# Altium schematic symbol library Regulator_Linear.SchLib: 1538 symbols (part 3 of 9) (continued)
## LD3985M122R_SOT23 (continued)
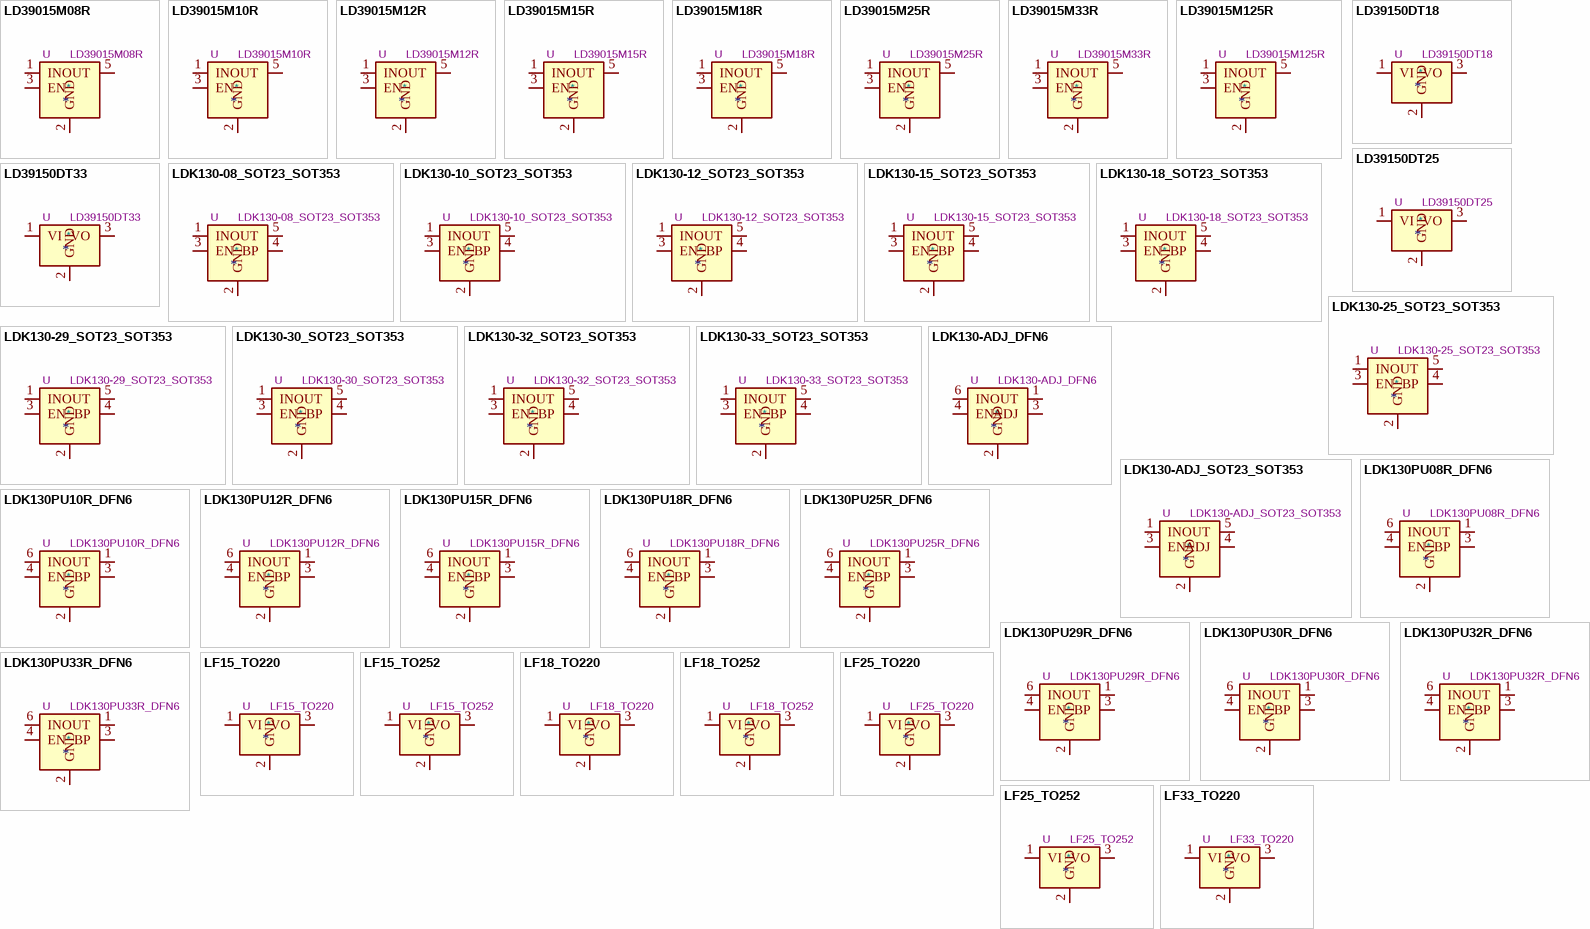
[diagram p11: symbols LD39015M08R to LF33_TO220]

## LD39015M08R
designator *  value LD39015M08R  Reference: U
ki_keywords: 150mA LDO Regulator Fixed Positive; ki_description: 150mA low quiescent current low noise voltage regulator, Fixed Output 0.8V, SOT-23-5; ki_fp_filters: SOT?23*; Footprint: Package_TO_SOT_SMD:SOT-23-5; Datasheet: http://www.st.com/resource/en/datasheet/ld39015.pdf
pins: 1 IN, 2 GND, 3 EN, 4 NC hidden, 5 OUT

## LD39015M10R
designator *  value LD39015M10R  Reference: U
ki_keywords: 150mA LDO Regulator Fixed Positive; ki_description: 150mA low quiescent current low noise voltage regulator, Fixed Output 1.0V, SOT-23-5; ki_fp_filters: SOT?23*; Footprint: Package_TO_SOT_SMD:SOT-23-5; Datasheet: http://www.st.com/resource/en/datasheet/ld39015.pdf
pins: 1 IN, 2 GND, 3 EN, 4 NC hidden, 5 OUT

## LD39015M12R
designator *  value LD39015M12R  Reference: U
ki_keywords: 150mA LDO Regulator Fixed Positive; ki_description: 150mA low quiescent current low noise voltage regulator, Fixed Output 1.2V, SOT-23-5; ki_fp_filters: SOT?23*; Footprint: Package_TO_SOT_SMD:SOT-23-5; Datasheet: http://www.st.com/resource/en/datasheet/ld39015.pdf
pins: 1 IN, 2 GND, 3 EN, 4 NC hidden, 5 OUT

## LD39015M15R
designator *  value LD39015M15R  Reference: U
ki_keywords: 150mA LDO Regulator Fixed Positive; ki_description: 150mA low quiescent current low noise voltage regulator, Fixed Output 1.5V, SOT-23-5; ki_fp_filters: SOT?23*; Footprint: Package_TO_SOT_SMD:SOT-23-5; Datasheet: http://www.st.com/resource/en/datasheet/ld39015.pdf
pins: 1 IN, 2 GND, 3 EN, 4 NC hidden, 5 OUT

## LD39015M18R
designator *  value LD39015M18R  Reference: U
ki_keywords: 150mA LDO Regulator Fixed Positive; ki_description: 150mA low quiescent current low noise voltage regulator, Fixed Output 1.8V, SOT-23-5; ki_fp_filters: SOT?23*; Footprint: Package_TO_SOT_SMD:SOT-23-5; Datasheet: http://www.st.com/resource/en/datasheet/ld39015.pdf
pins: 1 IN, 2 GND, 3 EN, 4 NC hidden, 5 OUT

## LD39015M25R
designator *  value LD39015M25R  Reference: U
ki_keywords: 150mA LDO Regulator Fixed Positive; ki_description: 150mA low quiescent current low noise voltage regulator, Fixed Output 2.5V, SOT-23-5; ki_fp_filters: SOT?23*; Footprint: Package_TO_SOT_SMD:SOT-23-5; Datasheet: http://www.st.com/resource/en/datasheet/ld39015.pdf
pins: 1 IN, 2 GND, 3 EN, 4 NC hidden, 5 OUT

## LD39015M33R
designator *  value LD39015M33R  Reference: U
ki_keywords: 150mA LDO Regulator Fixed Positive; ki_description: 150mA low quiescent current low noise voltage regulator, Fixed Output 3.3V, SOT-23-5; ki_fp_filters: SOT?23*; Footprint: Package_TO_SOT_SMD:SOT-23-5; Datasheet: http://www.st.com/resource/en/datasheet/ld39015.pdf
pins: 1 IN, 2 GND, 3 EN, 4 NC hidden, 5 OUT

## LD39015M125R
designator *  value LD39015M125R  Reference: U
ki_keywords: 150mA LDO Regulator Fixed Positive; ki_description: 150mA low quiescent current low noise voltage regulator, Fixed Output 1.25V, SOT-23-5; ki_fp_filters: SOT?23*; Footprint: Package_TO_SOT_SMD:SOT-23-5; Datasheet: http://www.st.com/resource/en/datasheet/ld39015.pdf
pins: 1 IN, 2 GND, 3 EN, 4 NC hidden, 5 OUT

## LD39150DT18
designator *  value LD39150DT18  Reference: U
ki_keywords: linear regulator ldo fixed positive; ki_description: 1.5A Ultra Low Dropout regulator, positive, 1.8V fixed output, TO-252; ki_fp_filters: TO?252*TabPin2*; Footprint: Package_TO_SOT_SMD:TO-252-3_TabPin2; Datasheet: https://www.st.com/resource/en/datasheet/ld39150.pdf
pins: 1 VI, 2 GND, 3 VO

## LD39150DT25
designator *  value LD39150DT25  Reference: U
ki_keywords: linear regulator ldo fixed positive; ki_description: 1.5A Ultra Low Dropout regulator, positive, 2.5V fixed output, TO-252; ki_fp_filters: TO?252*TabPin2*; Footprint: Package_TO_SOT_SMD:TO-252-3_TabPin2; Datasheet: https://www.st.com/resource/en/datasheet/ld39150.pdf
pins: 1 VI, 2 GND, 3 VO

## LD39150DT33
designator *  value LD39150DT33  Reference: U
ki_keywords: linear regulator ldo fixed positive; ki_description: 1.5A Ultra Low Dropout regulator, positive, 3.3V fixed output, TO-252; ki_fp_filters: TO?252*TabPin2*; Footprint: Package_TO_SOT_SMD:TO-252-3_TabPin2; Datasheet: https://www.st.com/resource/en/datasheet/ld39150.pdf
pins: 1 VI, 2 GND, 3 VO

## LDK130-08_SOT23_SOT353
designator *  value LDK130-08_SOT23_SOT353  Reference: U
ki_keywords: linear regulator ldo fixed positive low noise low quienscent current; ki_description: 300mA low dropout linear regulator, low quiescent current very, low noise, shutdown pin, 0.8V fixed positive output, SOT-23-5/SOT-353-5/SC-70-5; ki_fp_filters: SOT?23* SOT?353* *SC?70*; Datasheet: http://www.st.com/content/ccc/resource/technical/document/datasheet/29/10/f7/87/2f/66/47/f4/DM00076097.pdf/files/DM00076097.pdf/jcr:content/translations/en.DM00076097.pdf
pins: 1 IN, 2 GND, 3 EN, 4 BP, 5 OUT

## LDK130-10_SOT23_SOT353
designator *  value LDK130-10_SOT23_SOT353  Reference: U
ki_keywords: linear regulator ldo fixed positive low noise low quienscent current; ki_description: 300mA low dropout linear regulator, low quiescent current very, low noise, shutdown pin, 1.0V fixed positive output, SOT-23-5/SOT-353-5/SC-70-5; ki_fp_filters: SOT?23* SOT?353* *SC?70*; Datasheet: http://www.st.com/content/ccc/resource/technical/document/datasheet/29/10/f7/87/2f/66/47/f4/DM00076097.pdf/files/DM00076097.pdf/jcr:content/translations/en.DM00076097.pdf
pins: 1 IN, 2 GND, 3 EN, 4 BP, 5 OUT

## LDK130-12_SOT23_SOT353
designator *  value LDK130-12_SOT23_SOT353  Reference: U
ki_keywords: linear regulator ldo fixed positive low noise low quienscent current; ki_description: 300mA low dropout linear regulator, low quiescent current very, low noise, shutdown pin, 1.2V fixed positive output, SOT-23-5/SOT-353-5/SC-70-5; ki_fp_filters: SOT?23* SOT?353* *SC?70*; Datasheet: http://www.st.com/content/ccc/resource/technical/document/datasheet/29/10/f7/87/2f/66/47/f4/DM00076097.pdf/files/DM00076097.pdf/jcr:content/translations/en.DM00076097.pdf
pins: 1 IN, 2 GND, 3 EN, 4 BP, 5 OUT

## LDK130-15_SOT23_SOT353
designator *  value LDK130-15_SOT23_SOT353  Reference: U
ki_keywords: linear regulator ldo fixed positive low noise low quienscent current; ki_description: 300mA low dropout linear regulator, low quiescent current very, low noise, shutdown pin, 1.5V fixed positive output, SOT-23-5/SOT-353-5/SC-70-5; ki_fp_filters: SOT?23* SOT?353* *SC?70*; Datasheet: http://www.st.com/content/ccc/resource/technical/document/datasheet/29/10/f7/87/2f/66/47/f4/DM00076097.pdf/files/DM00076097.pdf/jcr:content/translations/en.DM00076097.pdf
pins: 1 IN, 2 GND, 3 EN, 4 BP, 5 OUT

## LDK130-18_SOT23_SOT353
designator *  value LDK130-18_SOT23_SOT353  Reference: U
ki_keywords: linear regulator ldo fixed positive low noise low quienscent current; ki_description: 300mA low dropout linear regulator, low quiescent current very, low noise, shutdown pin, 1.8V fixed positive output, SOT-23-5/SOT-353-5/SC-70-5; ki_fp_filters: SOT?23* SOT?353* *SC?70*; Datasheet: http://www.st.com/content/ccc/resource/technical/document/datasheet/29/10/f7/87/2f/66/47/f4/DM00076097.pdf/files/DM00076097.pdf/jcr:content/translations/en.DM00076097.pdf
pins: 1 IN, 2 GND, 3 EN, 4 BP, 5 OUT

## LDK130-25_SOT23_SOT353
designator *  value LDK130-25_SOT23_SOT353  Reference: U
ki_keywords: linear regulator ldo fixed positive low noise low quienscent current; ki_description: 300mA low dropout linear regulator, low quiescent current very, low noise, shutdown pin, 2.5V fixed positive output, SOT-23-5/SOT-353-5/SC-70-5; ki_fp_filters: SOT?23* SOT?353* *SC?70*; Datasheet: http://www.st.com/content/ccc/resource/technical/document/datasheet/29/10/f7/87/2f/66/47/f4/DM00076097.pdf/files/DM00076097.pdf/jcr:content/translations/en.DM00076097.pdf
pins: 1 IN, 2 GND, 3 EN, 4 BP, 5 OUT

## LDK130-29_SOT23_SOT353
designator *  value LDK130-29_SOT23_SOT353  Reference: U
ki_keywords: linear regulator ldo fixed positive low noise low quienscent current; ki_description: 300mA low dropout linear regulator, low quiescent current very, low noise, shutdown pin, 2.9V fixed positive output, SOT-23-5/SOT-353-5/SC-70-5; ki_fp_filters: SOT?23* SOT?353* *SC?70*; Datasheet: http://www.st.com/content/ccc/resource/technical/document/datasheet/29/10/f7/87/2f/66/47/f4/DM00076097.pdf/files/DM00076097.pdf/jcr:content/translations/en.DM00076097.pdf
pins: 1 IN, 2 GND, 3 EN, 4 BP, 5 OUT

## LDK130-30_SOT23_SOT353
designator *  value LDK130-30_SOT23_SOT353  Reference: U
ki_keywords: linear regulator ldo fixed positive low noise low quienscent current; ki_description: 300mA low dropout linear regulator, low quiescent current very, low noise, shutdown pin, 3.0V fixed positive output, SOT-23-5/SOT-353-5/SC-70-5; ki_fp_filters: SOT?23* SOT?353* *SC?70*; Datasheet: http://www.st.com/content/ccc/resource/technical/document/datasheet/29/10/f7/87/2f/66/47/f4/DM00076097.pdf/files/DM00076097.pdf/jcr:content/translations/en.DM00076097.pdf
pins: 1 IN, 2 GND, 3 EN, 4 BP, 5 OUT

## LDK130-32_SOT23_SOT353
designator *  value LDK130-32_SOT23_SOT353  Reference: U
ki_keywords: linear regulator ldo fixed positive low noise low quienscent current; ki_description: 300mA low dropout linear regulator, low quiescent current very, low noise, shutdown pin, 3.2V fixed positive output, SOT-23-5/SOT-353-5/SC-70-5; ki_fp_filters: SOT?23* SOT?353* *SC?70*; Datasheet: http://www.st.com/content/ccc/resource/technical/document/datasheet/29/10/f7/87/2f/66/47/f4/DM00076097.pdf/files/DM00076097.pdf/jcr:content/translations/en.DM00076097.pdf
pins: 1 IN, 2 GND, 3 EN, 4 BP, 5 OUT

## LDK130-33_SOT23_SOT353
designator *  value LDK130-33_SOT23_SOT353  Reference: U
ki_keywords: linear regulator ldo fixed positive low noise low quienscent current; ki_description: 300mA low dropout linear regulator, low quiescent current very, low noise, shutdown pin, 3.3V fixed positive output, SOT-23-5/SOT-353-5/SC-70-5; ki_fp_filters: SOT?23* SOT?353* *SC?70*; Datasheet: http://www.st.com/content/ccc/resource/technical/document/datasheet/29/10/f7/87/2f/66/47/f4/DM00076097.pdf/files/DM00076097.pdf/jcr:content/translations/en.DM00076097.pdf
pins: 1 IN, 2 GND, 3 EN, 4 BP, 5 OUT

## LDK130-ADJ_DFN6
designator *  value LDK130-ADJ_DFN6  Reference: U
ki_keywords: linear regulator ldo adjustable positive low noise low quienscent current; ki_description: 300mA low dropout linear regulator, low quiescent current very, low noise, shutdown pin, adjustable positive output, DFN-6; ki_fp_filters: DFN*1.3x1.2mm*P0.4mm*; Footprint: Package_DFN_QFN:DFN-6_1.3x1.2mm_P0.4mm; Datasheet: http://www.st.com/content/ccc/resource/technical/document/datasheet/29/10/f7/87/2f/66/47/f4/DM00076097.pdf/files/DM00076097.pdf/jcr:content/translations/en.DM00076097.pdf
pins: 1 OUT, 2 GND, 3 ADJ, 4 EN, 5 NC hidden, 6 IN

## LDK130-ADJ_SOT23_SOT353
designator *  value LDK130-ADJ_SOT23_SOT353  Reference: U
ki_keywords: linear regulator ldo adjustable positive low noise low quienscent current; ki_description: 300mA low dropout linear regulator, low quiescent current very, low noise, shutdown pin, adjustable positive output, SOT-23-5/SOT-353-5/SC-70-5; ki_fp_filters: SOT?23* SOT?353* *SC?70*; Datasheet: http://www.st.com/content/ccc/resource/technical/document/datasheet/29/10/f7/87/2f/66/47/f4/DM00076097.pdf/files/DM00076097.pdf/jcr:content/translations/en.DM00076097.pdf
pins: 1 IN, 2 GND, 3 EN, 4 ADJ, 5 OUT

## LDK130PU08R_DFN6
designator *  value LDK130PU08R_DFN6  Reference: U
ki_keywords: linear regulator ldo fixed positive low noise low quienscent current; ki_description: 300mA low dropout linear regulator, low quiescent current very, low noise, shutdown pin, fixed 0.8V positive output, DFN-6; ki_fp_filters: DFN*1.3x1.2mm*P0.4mm*; Footprint: Package_DFN_QFN:DFN-6_1.3x1.2mm_P0.4mm; Datasheet: http://www.st.com/content/ccc/resource/technical/document/datasheet/29/10/f7/87/2f/66/47/f4/DM00076097.pdf/files/DM00076097.pdf/jcr:content/translations/en.DM00076097.pdf
pins: 1 OUT, 2 GND, 3 BP, 4 EN, 5 NC hidden, 6 IN

## LDK130PU10R_DFN6
designator *  value LDK130PU10R_DFN6  Reference: U
ki_keywords: linear regulator ldo fixed positive low noise low quienscent current; ki_description: 300mA low dropout linear regulator, low quiescent current very, low noise, shutdown pin, fixed 1.0V positive output, DFN-6; ki_fp_filters: DFN*1.3x1.2mm*P0.4mm*; Footprint: Package_DFN_QFN:DFN-6_1.3x1.2mm_P0.4mm; Datasheet: http://www.st.com/content/ccc/resource/technical/document/datasheet/29/10/f7/87/2f/66/47/f4/DM00076097.pdf/files/DM00076097.pdf/jcr:content/translations/en.DM00076097.pdf
pins: 1 OUT, 2 GND, 3 BP, 4 EN, 5 NC hidden, 6 IN

## LDK130PU12R_DFN6
designator *  value LDK130PU12R_DFN6  Reference: U
ki_keywords: linear regulator ldo fixed positive low noise low quienscent current; ki_description: 300mA low dropout linear regulator, low quiescent current very, low noise, shutdown pin, fixed 1.2V positive output, DFN-6; ki_fp_filters: DFN*1.3x1.2mm*P0.4mm*; Footprint: Package_DFN_QFN:DFN-6_1.3x1.2mm_P0.4mm; Datasheet: http://www.st.com/content/ccc/resource/technical/document/datasheet/29/10/f7/87/2f/66/47/f4/DM00076097.pdf/files/DM00076097.pdf/jcr:content/translations/en.DM00076097.pdf
pins: 1 OUT, 2 GND, 3 BP, 4 EN, 5 NC hidden, 6 IN

## LDK130PU15R_DFN6
designator *  value LDK130PU15R_DFN6  Reference: U
ki_keywords: linear regulator ldo fixed positive low noise low quienscent current; ki_description: 300mA low dropout linear regulator, low quiescent current very, low noise, shutdown pin, fixed 1.5V positive output, DFN-6; ki_fp_filters: DFN*1.3x1.2mm*P0.4mm*; Footprint: Package_DFN_QFN:DFN-6_1.3x1.2mm_P0.4mm; Datasheet: http://www.st.com/content/ccc/resource/technical/document/datasheet/29/10/f7/87/2f/66/47/f4/DM00076097.pdf/files/DM00076097.pdf/jcr:content/translations/en.DM00076097.pdf
pins: 1 OUT, 2 GND, 3 BP, 4 EN, 5 NC hidden, 6 IN

## LDK130PU18R_DFN6
designator *  value LDK130PU18R_DFN6  Reference: U
ki_keywords: linear regulator ldo fixed positive low noise low quienscent current; ki_description: 300mA low dropout linear regulator, low quiescent current very, low noise, shutdown pin, fixed 1.8V positive output, DFN-6; ki_fp_filters: DFN*1.3x1.2mm*P0.4mm*; Footprint: Package_DFN_QFN:DFN-6_1.3x1.2mm_P0.4mm; Datasheet: http://www.st.com/content/ccc/resource/technical/document/datasheet/29/10/f7/87/2f/66/47/f4/DM00076097.pdf/files/DM00076097.pdf/jcr:content/translations/en.DM00076097.pdf
pins: 1 OUT, 2 GND, 3 BP, 4 EN, 5 NC hidden, 6 IN

## LDK130PU25R_DFN6
designator *  value LDK130PU25R_DFN6  Reference: U
ki_keywords: linear regulator ldo fixed positive low noise low quienscent current; ki_description: 300mA low dropout linear regulator, low quiescent current very, low noise, shutdown pin, fixed 2.5V positive output, DFN-6; ki_fp_filters: DFN*1.3x1.2mm*P0.4mm*; Footprint: Package_DFN_QFN:DFN-6_1.3x1.2mm_P0.4mm; Datasheet: http://www.st.com/content/ccc/resource/technical/document/datasheet/29/10/f7/87/2f/66/47/f4/DM00076097.pdf/files/DM00076097.pdf/jcr:content/translations/en.DM00076097.pdf
pins: 1 OUT, 2 GND, 3 BP, 4 EN, 5 NC hidden, 6 IN

## LDK130PU29R_DFN6
designator *  value LDK130PU29R_DFN6  Reference: U
ki_keywords: linear regulator ldo fixed positive low noise low quienscent current; ki_description: 300mA low dropout linear regulator, low quiescent current very, low noise, shutdown pin, fixed 2.9V positive output, DFN-6; ki_fp_filters: DFN*1.3x1.2mm*P0.4mm*; Footprint: Package_DFN_QFN:DFN-6_1.3x1.2mm_P0.4mm; Datasheet: http://www.st.com/content/ccc/resource/technical/document/datasheet/29/10/f7/87/2f/66/47/f4/DM00076097.pdf/files/DM00076097.pdf/jcr:content/translations/en.DM00076097.pdf
pins: 1 OUT, 2 GND, 3 BP, 4 EN, 5 NC hidden, 6 IN

## LDK130PU30R_DFN6
designator *  value LDK130PU30R_DFN6  Reference: U
ki_keywords: linear regulator ldo fixed positive low noise low quienscent current; ki_description: 300mA low dropout linear regulator, low quiescent current very, low noise, shutdown pin, fixed 3.0V positive output, DFN-6; ki_fp_filters: DFN*1.3x1.2mm*P0.4mm*; Footprint: Package_DFN_QFN:DFN-6_1.3x1.2mm_P0.4mm; Datasheet: http://www.st.com/content/ccc/resource/technical/document/datasheet/29/10/f7/87/2f/66/47/f4/DM00076097.pdf/files/DM00076097.pdf/jcr:content/translations/en.DM00076097.pdf
pins: 1 OUT, 2 GND, 3 BP, 4 EN, 5 NC hidden, 6 IN

## LDK130PU32R_DFN6
designator *  value LDK130PU32R_DFN6  Reference: U
ki_keywords: linear regulator ldo fixed positive low noise low quienscent current; ki_description: 300mA low dropout linear regulator, low quiescent current very, low noise, shutdown pin, fixed 3.2V positive output, DFN-6; ki_fp_filters: DFN*1.3x1.2mm*P0.4mm*; Footprint: Package_DFN_QFN:DFN-6_1.3x1.2mm_P0.4mm; Datasheet: http://www.st.com/content/ccc/resource/technical/document/datasheet/29/10/f7/87/2f/66/47/f4/DM00076097.pdf/files/DM00076097.pdf/jcr:content/translations/en.DM00076097.pdf
pins: 1 OUT, 2 GND, 3 BP, 4 EN, 5 NC hidden, 6 IN

## LDK130PU33R_DFN6
designator *  value LDK130PU33R_DFN6  Reference: U
ki_keywords: linear regulator ldo fixed positive low noise low quienscent current; ki_description: 300mA low dropout linear regulator, low quiescent current very, low noise, shutdown pin, fixed 3.3V positive output, DFN-6; ki_fp_filters: DFN*1.3x1.2mm*P0.4mm*; Footprint: Package_DFN_QFN:DFN-6_1.3x1.2mm_P0.4mm; Datasheet: http://www.st.com/content/ccc/resource/technical/document/datasheet/29/10/f7/87/2f/66/47/f4/DM00076097.pdf/files/DM00076097.pdf/jcr:content/translations/en.DM00076097.pdf
pins: 1 OUT, 2 GND, 3 BP, 4 EN, 5 NC hidden, 6 IN

## LF15_TO220
designator *  value LF15_TO220  Reference: U
ki_keywords: LDO regulator voltage; ki_description: Low-drop Voltage Regulator, Io up to 500mA, Fixed Vo 1.5V, TO-220; ki_fp_filters: TO?220*; Footprint: Package_TO_SOT_THT:TO-220-3_Vertical; Datasheet: http://www.st.com/content/ccc/resource/technical/document/datasheet/c4/0e/7e/2a/be/bc/4c/bd/CD00000546.pdf/files/CD00000546.pdf/jcr:content/translations/en.CD00000546.pdf
pins: 1 VI, 2 GND, 3 VO

## LF15_TO252
designator *  value LF15_TO252  Reference: U
ki_keywords: LDO regulator voltage; ki_description: Low-drop Voltage Regulator, Io up to 500mA, Fixed Vo 1.5V, TO-252 (DPAK); ki_fp_filters: TO?252*; Footprint: Package_TO_SOT_SMD:TO-252-2; Datasheet: http://www.st.com/content/ccc/resource/technical/document/datasheet/c4/0e/7e/2a/be/bc/4c/bd/CD00000546.pdf/files/CD00000546.pdf/jcr:content/translations/en.CD00000546.pdf
pins: 1 VI, 2 GND, 3 VO

## LF18_TO220
designator *  value LF18_TO220  Reference: U
ki_keywords: LDO regulator voltage; ki_description: Low-drop Voltage Regulator, Io up to 500mA, Fixed Vo 1.8V, TO-220; ki_fp_filters: TO?220*; Footprint: Package_TO_SOT_THT:TO-220-3_Vertical; Datasheet: http://www.st.com/content/ccc/resource/technical/document/datasheet/c4/0e/7e/2a/be/bc/4c/bd/CD00000546.pdf/files/CD00000546.pdf/jcr:content/translations/en.CD00000546.pdf
pins: 1 VI, 2 GND, 3 VO

## LF18_TO252
designator *  value LF18_TO252  Reference: U
ki_keywords: LDO regulator voltage; ki_description: Low-drop Voltage Regulator, Io up to 500mA, Fixed Vo 1.8V, TO-252 (DPAK); ki_fp_filters: TO?252*; Footprint: Package_TO_SOT_SMD:TO-252-2; Datasheet: http://www.st.com/content/ccc/resource/technical/document/datasheet/c4/0e/7e/2a/be/bc/4c/bd/CD00000546.pdf/files/CD00000546.pdf/jcr:content/translations/en.CD00000546.pdf
pins: 1 VI, 2 GND, 3 VO

## LF25_TO220
designator *  value LF25_TO220  Reference: U
ki_keywords: LDO regulator voltage; ki_description: Low-drop Voltage Regulator, Io up to 500mA, Fixed Vo 2.5V, TO-220; ki_fp_filters: TO?220*; Footprint: Package_TO_SOT_THT:TO-220-3_Vertical; Datasheet: http://www.st.com/content/ccc/resource/technical/document/datasheet/c4/0e/7e/2a/be/bc/4c/bd/CD00000546.pdf/files/CD00000546.pdf/jcr:content/translations/en.CD00000546.pdf
pins: 1 VI, 2 GND, 3 VO

## LF25_TO252
designator *  value LF25_TO252  Reference: U
ki_keywords: LDO regulator voltage; ki_description: Low-drop Voltage Regulator, Io up to 500mA, Fixed Vo 2.5V, TO-252 (DPAK); ki_fp_filters: TO?252*; Footprint: Package_TO_SOT_SMD:TO-252-2; Datasheet: http://www.st.com/content/ccc/resource/technical/document/datasheet/c4/0e/7e/2a/be/bc/4c/bd/CD00000546.pdf/files/CD00000546.pdf/jcr:content/translations/en.CD00000546.pdf
pins: 1 VI, 2 GND, 3 VO

## LF33_TO220
designator *  value LF33_TO220  Reference: U
ki_keywords: LDO regulator voltage; ki_description: Low-drop Voltage Regulator, Io up to 500mA, Fixed Vo 3.3V, TO-220; ki_fp_filters: TO?220*; Footprint: Package_TO_SOT_THT:TO-220-3_Vertical; Datasheet: http://www.st.com/content/ccc/resource/technical/document/datasheet/c4/0e/7e/2a/be/bc/4c/bd/CD00000546.pdf/files/CD00000546.pdf/jcr:content/translations/en.CD00000546.pdf
pins: 1 VI, 2 GND, 3 VO

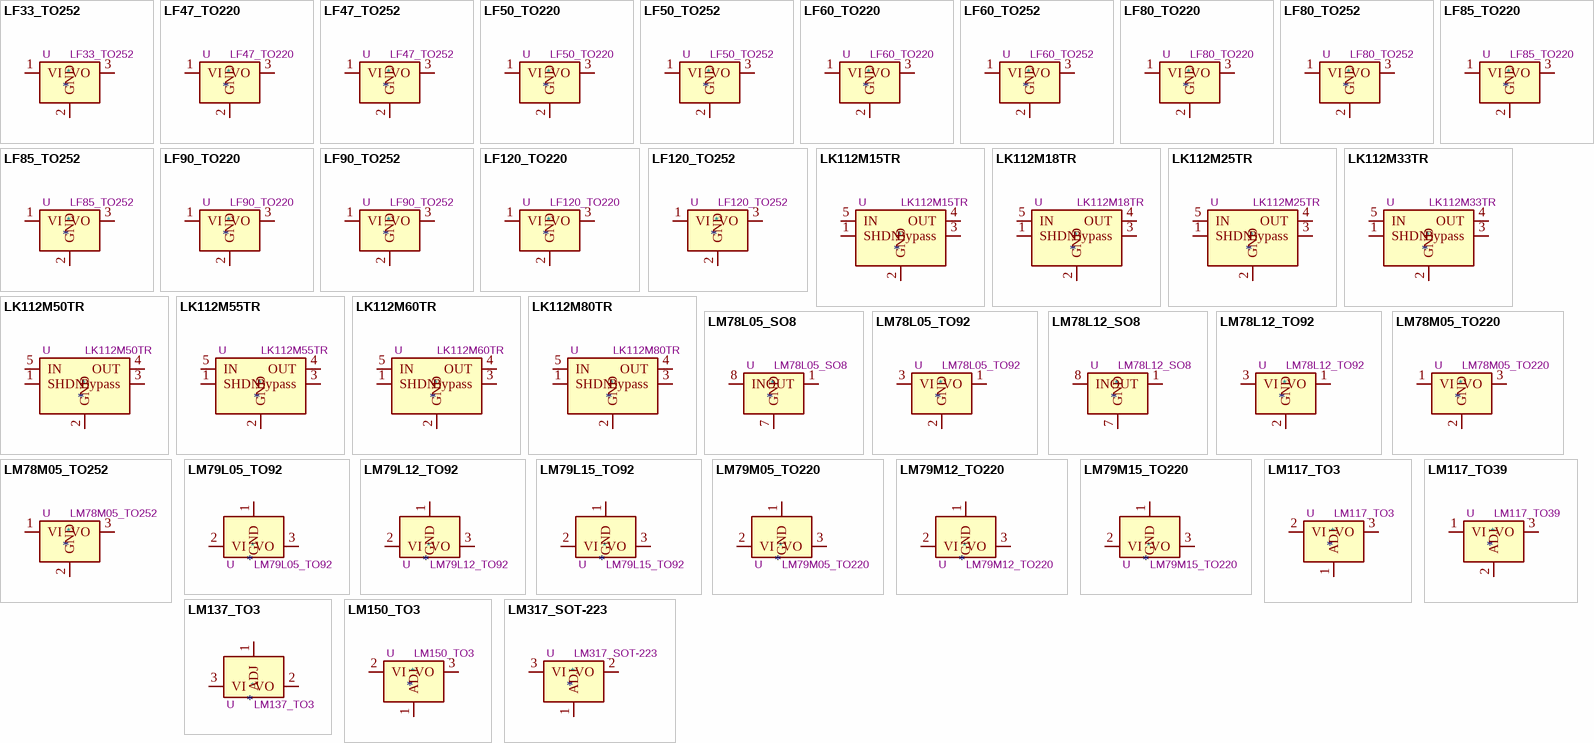
[diagram p12: symbols LF33_TO252 to LM317_SOT-223]

## LF33_TO252
designator *  value LF33_TO252  Reference: U
ki_keywords: LDO regulator voltage; ki_description: Low-drop Voltage Regulator, Io up to 500mA, Fixed Vo 3.3V, TO-252 (DPAK); ki_fp_filters: TO?252*; Footprint: Package_TO_SOT_SMD:TO-252-2; Datasheet: http://www.st.com/content/ccc/resource/technical/document/datasheet/c4/0e/7e/2a/be/bc/4c/bd/CD00000546.pdf/files/CD00000546.pdf/jcr:content/translations/en.CD00000546.pdf
pins: 1 VI, 2 GND, 3 VO

## LF47_TO220
designator *  value LF47_TO220  Reference: U
ki_keywords: LDO regulator voltage; ki_description: Low-drop Voltage Regulator, Io up to 500mA, Fixed Vo 4.7V, TO-220; ki_fp_filters: TO?220*; Footprint: Package_TO_SOT_THT:TO-220-3_Vertical; Datasheet: http://www.st.com/content/ccc/resource/technical/document/datasheet/c4/0e/7e/2a/be/bc/4c/bd/CD00000546.pdf/files/CD00000546.pdf/jcr:content/translations/en.CD00000546.pdf
pins: 1 VI, 2 GND, 3 VO

## LF47_TO252
designator *  value LF47_TO252  Reference: U
ki_keywords: LDO regulator voltage; ki_description: Low-drop Voltage Regulator, Io up to 500mA, Fixed Vo 4.7V, TO-252 (DPAK); ki_fp_filters: TO?252*; Footprint: Package_TO_SOT_SMD:TO-252-2; Datasheet: http://www.st.com/content/ccc/resource/technical/document/datasheet/c4/0e/7e/2a/be/bc/4c/bd/CD00000546.pdf/files/CD00000546.pdf/jcr:content/translations/en.CD00000546.pdf
pins: 1 VI, 2 GND, 3 VO

## LF50_TO220
designator *  value LF50_TO220  Reference: U
ki_keywords: LDO regulator voltage; ki_description: Low-drop Voltage Regulator, Io up to 500mA, Fixed Vo 5.0V, TO-220; ki_fp_filters: TO?220*; Footprint: Package_TO_SOT_THT:TO-220-3_Vertical; Datasheet: http://www.st.com/content/ccc/resource/technical/document/datasheet/c4/0e/7e/2a/be/bc/4c/bd/CD00000546.pdf/files/CD00000546.pdf/jcr:content/translations/en.CD00000546.pdf
pins: 1 VI, 2 GND, 3 VO

## LF50_TO252
designator *  value LF50_TO252  Reference: U
ki_keywords: LDO regulator voltage; ki_description: Low-drop Voltage Regulator, Io up to 500mA, Fixed Vo 5.0V, TO-252 (DPAK); ki_fp_filters: TO?252*; Footprint: Package_TO_SOT_SMD:TO-252-2; Datasheet: http://www.st.com/content/ccc/resource/technical/document/datasheet/c4/0e/7e/2a/be/bc/4c/bd/CD00000546.pdf/files/CD00000546.pdf/jcr:content/translations/en.CD00000546.pdf
pins: 1 VI, 2 GND, 3 VO

## LF60_TO220
designator *  value LF60_TO220  Reference: U
ki_keywords: LDO regulator voltage; ki_description: Low-drop Voltage Regulator, Io up to 500mA, Fixed Vo 6.0V, TO-220; ki_fp_filters: TO?220*; Footprint: Package_TO_SOT_THT:TO-220-3_Vertical; Datasheet: http://www.st.com/content/ccc/resource/technical/document/datasheet/c4/0e/7e/2a/be/bc/4c/bd/CD00000546.pdf/files/CD00000546.pdf/jcr:content/translations/en.CD00000546.pdf
pins: 1 VI, 2 GND, 3 VO

## LF60_TO252
designator *  value LF60_TO252  Reference: U
ki_keywords: LDO regulator voltage; ki_description: Low-drop Voltage Regulator, Io up to 500mA, Fixed Vo 6.0V, TO-252 (DPAK); ki_fp_filters: TO?252*; Footprint: Package_TO_SOT_SMD:TO-252-2; Datasheet: http://www.st.com/content/ccc/resource/technical/document/datasheet/c4/0e/7e/2a/be/bc/4c/bd/CD00000546.pdf/files/CD00000546.pdf/jcr:content/translations/en.CD00000546.pdf
pins: 1 VI, 2 GND, 3 VO

## LF80_TO220
designator *  value LF80_TO220  Reference: U
ki_keywords: LDO regulator voltage; ki_description: Low-drop Voltage Regulator, Io up to 500mA, Fixed Vo 8.0V, TO-220; ki_fp_filters: TO?220*; Footprint: Package_TO_SOT_THT:TO-220-3_Vertical; Datasheet: http://www.st.com/content/ccc/resource/technical/document/datasheet/c4/0e/7e/2a/be/bc/4c/bd/CD00000546.pdf/files/CD00000546.pdf/jcr:content/translations/en.CD00000546.pdf
pins: 1 VI, 2 GND, 3 VO

## LF80_TO252
designator *  value LF80_TO252  Reference: U
ki_keywords: LDO regulator voltage; ki_description: Low-drop Voltage Regulator, Io up to 500mA, Fixed Vo 8.0V, TO-252 (DPAK); ki_fp_filters: TO?252*; Footprint: Package_TO_SOT_SMD:TO-252-2; Datasheet: http://www.st.com/content/ccc/resource/technical/document/datasheet/c4/0e/7e/2a/be/bc/4c/bd/CD00000546.pdf/files/CD00000546.pdf/jcr:content/translations/en.CD00000546.pdf
pins: 1 VI, 2 GND, 3 VO

## LF85_TO220
designator *  value LF85_TO220  Reference: U
ki_keywords: LDO regulator voltage; ki_description: Low-drop Voltage Regulator, Io up to 500mA, Fixed Vo 8.5V, TO-220; ki_fp_filters: TO?220*; Footprint: Package_TO_SOT_THT:TO-220-3_Vertical; Datasheet: http://www.st.com/content/ccc/resource/technical/document/datasheet/c4/0e/7e/2a/be/bc/4c/bd/CD00000546.pdf/files/CD00000546.pdf/jcr:content/translations/en.CD00000546.pdf
pins: 1 VI, 2 GND, 3 VO

## LF85_TO252
designator *  value LF85_TO252  Reference: U
ki_keywords: LDO regulator voltage; ki_description: Low-drop Voltage Regulator, Io up to 500mA, Fixed Vo 8.5V, TO-252 (DPAK); ki_fp_filters: TO?252*; Footprint: Package_TO_SOT_SMD:TO-252-2; Datasheet: http://www.st.com/content/ccc/resource/technical/document/datasheet/c4/0e/7e/2a/be/bc/4c/bd/CD00000546.pdf/files/CD00000546.pdf/jcr:content/translations/en.CD00000546.pdf
pins: 1 VI, 2 GND, 3 VO

## LF90_TO220
designator *  value LF90_TO220  Reference: U
ki_keywords: LDO regulator voltage; ki_description: Low-drop Voltage Regulator, Io up to 500mA, Fixed Vo 9.0V, TO-220; ki_fp_filters: TO?220*; Footprint: Package_TO_SOT_THT:TO-220-3_Vertical; Datasheet: http://www.st.com/content/ccc/resource/technical/document/datasheet/c4/0e/7e/2a/be/bc/4c/bd/CD00000546.pdf/files/CD00000546.pdf/jcr:content/translations/en.CD00000546.pdf
pins: 1 VI, 2 GND, 3 VO

## LF90_TO252
designator *  value LF90_TO252  Reference: U
ki_keywords: LDO regulator voltage; ki_description: Low-drop Voltage Regulator, Io up to 500mA, Fixed Vo 9.0V, TO-252 (DPAK); ki_fp_filters: TO?252*; Footprint: Package_TO_SOT_SMD:TO-252-2; Datasheet: http://www.st.com/content/ccc/resource/technical/document/datasheet/c4/0e/7e/2a/be/bc/4c/bd/CD00000546.pdf/files/CD00000546.pdf/jcr:content/translations/en.CD00000546.pdf
pins: 1 VI, 2 GND, 3 VO

## LF120_TO220
designator *  value LF120_TO220  Reference: U
ki_keywords: LDO regulator voltage; ki_description: Low-drop Voltage Regulator, Io up to 500mA, Fixed Vo 12.0V, TO-220; ki_fp_filters: TO?220*; Footprint: Package_TO_SOT_THT:TO-220-3_Vertical; Datasheet: http://www.st.com/content/ccc/resource/technical/document/datasheet/c4/0e/7e/2a/be/bc/4c/bd/CD00000546.pdf/files/CD00000546.pdf/jcr:content/translations/en.CD00000546.pdf
pins: 1 VI, 2 GND, 3 VO

## LF120_TO252
designator *  value LF120_TO252  Reference: U
ki_keywords: LDO regulator voltage; ki_description: Low-drop Voltage Regulator, Io up to 500mA, Fixed Vo 12.0V, TO-252 (DPAK); ki_fp_filters: TO?252*; Footprint: Package_TO_SOT_SMD:TO-252-2; Datasheet: http://www.st.com/content/ccc/resource/technical/document/datasheet/c4/0e/7e/2a/be/bc/4c/bd/CD00000546.pdf/files/CD00000546.pdf/jcr:content/translations/en.CD00000546.pdf
pins: 1 VI, 2 GND, 3 VO

## LK112M15TR
designator *  value LK112M15TR  Reference: U
ki_keywords: LDO regulator voltage; ki_description: Low noise and low drop voltage regulator with shutdown function, 150mA, Vout = 1.5V, SOT-23-5; ki_fp_filters: SOT?23*; Footprint: Package_TO_SOT_SMD:SOT-23-5; Datasheet: https://www.st.com/resource/ja/datasheet/lk112.pdf
pins: 1 SHDN, 2 GND, 3 Bypass, 4 OUT, 5 IN

## LK112M18TR
designator *  value LK112M18TR  Reference: U
ki_keywords: LDO regulator voltage; ki_description: Low noise and low drop voltage regulator with shutdown function, 150mA, Vout = 1.8V, SOT-23-5; ki_fp_filters: SOT?23*; Footprint: Package_TO_SOT_SMD:SOT-23-5; Datasheet: https://www.st.com/resource/ja/datasheet/lk112.pdf
pins: 1 SHDN, 2 GND, 3 Bypass, 4 OUT, 5 IN

## LK112M25TR
designator *  value LK112M25TR  Reference: U
ki_keywords: LDO regulator voltage; ki_description: Low noise and low drop voltage regulator with shutdown function, 150mA, Vout = 2.5V, SOT-23-5; ki_fp_filters: SOT?23*; Footprint: Package_TO_SOT_SMD:SOT-23-5; Datasheet: https://www.st.com/resource/ja/datasheet/lk112.pdf
pins: 1 SHDN, 2 GND, 3 Bypass, 4 OUT, 5 IN

## LK112M33TR
designator *  value LK112M33TR  Reference: U
ki_keywords: LDO regulator voltage; ki_description: Low noise and low drop voltage regulator with shutdown function, 150mA, Vout = 3.3V, SOT-23-5; ki_fp_filters: SOT?23*; Footprint: Package_TO_SOT_SMD:SOT-23-5; Datasheet: https://www.st.com/resource/ja/datasheet/lk112.pdf
pins: 1 SHDN, 2 GND, 3 Bypass, 4 OUT, 5 IN

## LK112M50TR
designator *  value LK112M50TR  Reference: U
ki_keywords: LDO regulator voltage; ki_description: Low noise and low drop voltage regulator with shutdown function, 150mA, Vout = 5.0V, SOT-23-5; ki_fp_filters: SOT?23*; Footprint: Package_TO_SOT_SMD:SOT-23-5; Datasheet: https://www.st.com/resource/ja/datasheet/lk112.pdf
pins: 1 SHDN, 2 GND, 3 Bypass, 4 OUT, 5 IN

## LK112M55TR
designator *  value LK112M55TR  Reference: U
ki_keywords: LDO regulator voltage; ki_description: Low noise and low drop voltage regulator with shutdown function, 150mA, Vout = 5.5V, SOT-23-5; ki_fp_filters: SOT?23*; Footprint: Package_TO_SOT_SMD:SOT-23-5; Datasheet: https://www.st.com/resource/ja/datasheet/lk112.pdf
pins: 1 SHDN, 2 GND, 3 Bypass, 4 OUT, 5 IN

## LK112M60TR
designator *  value LK112M60TR  Reference: U
ki_keywords: LDO regulator voltage; ki_description: Low noise and low drop voltage regulator with shutdown function, 150mA, Vout = 6.0V, SOT-23-5; ki_fp_filters: SOT?23*; Footprint: Package_TO_SOT_SMD:SOT-23-5; Datasheet: https://www.st.com/resource/ja/datasheet/lk112.pdf
pins: 1 SHDN, 2 GND, 3 Bypass, 4 OUT, 5 IN

## LK112M80TR
designator *  value LK112M80TR  Reference: U
ki_keywords: LDO regulator voltage; ki_description: Low noise and low drop voltage regulator with shutdown function, 150mA, Vout = 8.0V, SOT-23-5; ki_fp_filters: SOT?23*; Footprint: Package_TO_SOT_SMD:SOT-23-5; Datasheet: https://www.st.com/resource/ja/datasheet/lk112.pdf
pins: 1 SHDN, 2 GND, 3 Bypass, 4 OUT, 5 IN

## LM78L05_SO8
designator *  value LM78L05_SO8  Reference: U
ki_keywords: Voltage Regulator 100mA Positive; ki_description: Positive 100mA 30V Linear Regulator, Fixed Output 5V, SO-8; ki_fp_filters: SOIC*3.9x4.9mm*P1.27mm*; Footprint: Package_SO:SOIC-8_3.9x4.9mm_P1.27mm; Datasheet: https://www.onsemi.com/pub/Collateral/MC78L06A-D.pdf
pins: 1 OUT, 2 GND hidden, 3 GND hidden, 4 NC hidden, 5 NC hidden, 6 GND hidden, 7 GND, 8 IN

## LM78L05_TO92
designator *  value LM78L05_TO92  Reference: U
ki_keywords: Voltage Regulator 100mA Positive; ki_description: Positive 100mA 30V Linear Regulator, Fixed Output 5V, TO-92; ki_fp_filters: TO?92*; Footprint: Package_TO_SOT_THT:TO-92_Inline; Datasheet: https://www.onsemi.com/pub/Collateral/MC78L06A-D.pdf
pins: 1 VO, 2 GND, 3 VI

## LM78L12_SO8
designator *  value LM78L12_SO8  Reference: U
ki_keywords: Voltage Regulator 100mA Positive; ki_description: Positive 100mA 30V Linear Regulator, Fixed Output 12V, SO-8; ki_fp_filters: SOIC*3.9x4.9mm*P1.27mm*; Footprint: Package_SO:SOIC-8_3.9x4.9mm_P1.27mm; Datasheet: https://www.onsemi.com/pub/Collateral/MC78L06A-D.pdf
pins: 1 OUT, 2 GND hidden, 3 GND hidden, 4 NC hidden, 5 NC hidden, 6 GND hidden, 7 GND, 8 IN

## LM78L12_TO92
designator *  value LM78L12_TO92  Reference: U
ki_keywords: Voltage Regulator 100mA Positive; ki_description: Positive 100mA 30V Linear Regulator, Fixed Output 12V, TO-92; ki_fp_filters: TO?92*; Footprint: Package_TO_SOT_THT:TO-92_Inline; Datasheet: https://www.onsemi.com/pub/Collateral/MC78L06A-D.pdf
pins: 1 VO, 2 GND, 3 VI

## LM78M05_TO220
designator *  value LM78M05_TO220  Reference: U
ki_keywords: Voltage Regulator 500mA Positive; ki_description: Positive 500mA 35V Linear Regulator, Fixed Output 5V, TO-220; ki_fp_filters: TO?220*; Footprint: Package_TO_SOT_THT:TO-220-3_Vertical; Datasheet: https://www.onsemi.com/pub/Collateral/MC78M00-D.PDF
pins: 1 VI, 2 GND, 3 VO

## LM78M05_TO252
designator *  value LM78M05_TO252  Reference: U
ki_keywords: Voltage Regulator 500mA Positive; ki_description: Positive 500mA 35V Linear Regulator, Fixed Output 5V, TO-252 (D-PAK); ki_fp_filters: TO?252*; Footprint: Package_TO_SOT_SMD:TO-252-2; Datasheet: https://www.onsemi.com/pub/Collateral/MC78M00-D.PDF
pins: 1 VI, 2 GND, 3 VO

## LM79L05_TO92
designator *  value LM79L05_TO92  Reference: U
ki_keywords: negative regulatpr; ki_description: 3-Terminal Negative Regulator, -5V, TO-92; ki_fp_filters: TO?92*; Footprint: Package_TO_SOT_THT:TO-92_Inline; Datasheet: http://www.ti.com/lit/ds/symlink/lm79l.pdf
pins: 1 GND, 2 VI, 3 VO

## LM79L12_TO92
designator *  value LM79L12_TO92  Reference: U
ki_keywords: negative regulatpr; ki_description: 3-Terminal Negative Regulator, -12V, TO-92; ki_fp_filters: TO?92*; Footprint: Package_TO_SOT_THT:TO-92_Inline; Datasheet: http://www.ti.com/lit/ds/symlink/lm79l.pdf
pins: 1 GND, 2 VI, 3 VO

## LM79L15_TO92
designator *  value LM79L15_TO92  Reference: U
ki_keywords: negative regulatpr; ki_description: 3-Terminal Negative Regulator, -15V, TO-92; ki_fp_filters: TO?92*; Footprint: Package_TO_SOT_THT:TO-92_Inline; Datasheet: http://www.ti.com/lit/ds/symlink/lm79l.pdf
pins: 1 GND, 2 VI, 3 VO

## LM79M05_TO220
designator *  value LM79M05_TO220  Reference: U
ki_keywords: Voltage Regulator 500mA Negative; ki_description: Negative 500mA 35V Linear Regulator, Fixed Output 5V, TO-220; ki_fp_filters: TO?220*; Footprint: Package_TO_SOT_THT:TO-220-3_Vertical; Datasheet: https://www.onsemi.com/pub/Collateral/MC79M00-D.PDF
pins: 1 GND, 2 VI, 3 VO

## LM79M12_TO220
designator *  value LM79M12_TO220  Reference: U
ki_keywords: Voltage Regulator 500mA Negative; ki_description: Negative 500mA 35V Linear Regulator, Fixed Output 12V, TO-220; ki_fp_filters: TO?220*; Footprint: Package_TO_SOT_THT:TO-220-3_Vertical; Datasheet: https://www.onsemi.com/pub/Collateral/MC79M00-D.PDF
pins: 1 GND, 2 VI, 3 VO

## LM79M15_TO220
designator *  value LM79M15_TO220  Reference: U
ki_keywords: Voltage Regulator 500mA Negative; ki_description: Negative 500mA 35V Linear Regulator, Fixed Output 15V, TO-220; ki_fp_filters: TO?220*; Footprint: Package_TO_SOT_THT:TO-220-3_Vertical; Datasheet: https://www.onsemi.com/pub/Collateral/MC79M00-D.PDF
pins: 1 GND, 2 VI, 3 VO

## LM117_TO3
designator *  value LM117_TO3  Reference: U
ki_keywords: Adjustable Voltage Regulator 1,5A Positive; ki_description: 1,5A 35V Adjustable Linear Regulator, TO-3; ki_fp_filters: TO?3*; Footprint: Package_TO_SOT_THT:TO-3; Datasheet: http://www.ti.com/lit/ds/symlink/lm317.pdf
pins: 1 ADJ, 2 VI, 3 VO

## LM117_TO39
designator *  value LM117_TO39  Reference: U
ki_keywords: Adjustable Voltage Regulator 500mA Positive; ki_description: 500mA 35V Adjustable Linear Regulator, TO-39; ki_fp_filters: TO?39*; Footprint: Package_TO_SOT_THT:TO-39-3; Datasheet: http://www.ti.com/lit/ds/symlink/lm317.pdf
pins: 1 VI, 2 ADJ, 3 VO

## LM137_TO3
designator *  value LM137_TO3  Reference: U
ki_keywords: Adjustable Voltage Regulator 1.5A Negative; ki_description: Negative 1.5A 35V Adjustable Linear Regulator, TO-3; ki_fp_filters: TO?3*; Footprint: Package_TO_SOT_THT:TO-3; Datasheet: http://www.ti.com/lit/ds/symlink/lm337-n.pdf
pins: 1 ADJ, 2 VO, 3 VI

## LM150_TO3
designator *  value LM150_TO3  Reference: U
ki_keywords: Adjustable Voltage Regulator 3A Positive; ki_description: 3A 33V Adjustable Linear Regulator, TO-3; ki_fp_filters: TO?3*; Footprint: Package_TO_SOT_THT:TO-3; Datasheet: http://www.ti.com/lit/ds/symlink/lm350a.pdf
pins: 1 ADJ, 2 VI, 3 VO

## LM317_SOT-223
designator *  value LM317_SOT-223  Reference: U
ki_keywords: Adjustable Voltage Regulator 1A Positive; ki_description: 1.5A 35V Adjustable Linear Regulator, SOT-223; ki_fp_filters: SOT?223*TabPin2*; Footprint: Package_TO_SOT_SMD:SOT-223-3_TabPin2; Datasheet: http://www.ti.com/lit/ds/symlink/lm317.pdf
pins: 1 ADJ, 2 VO, 3 VI

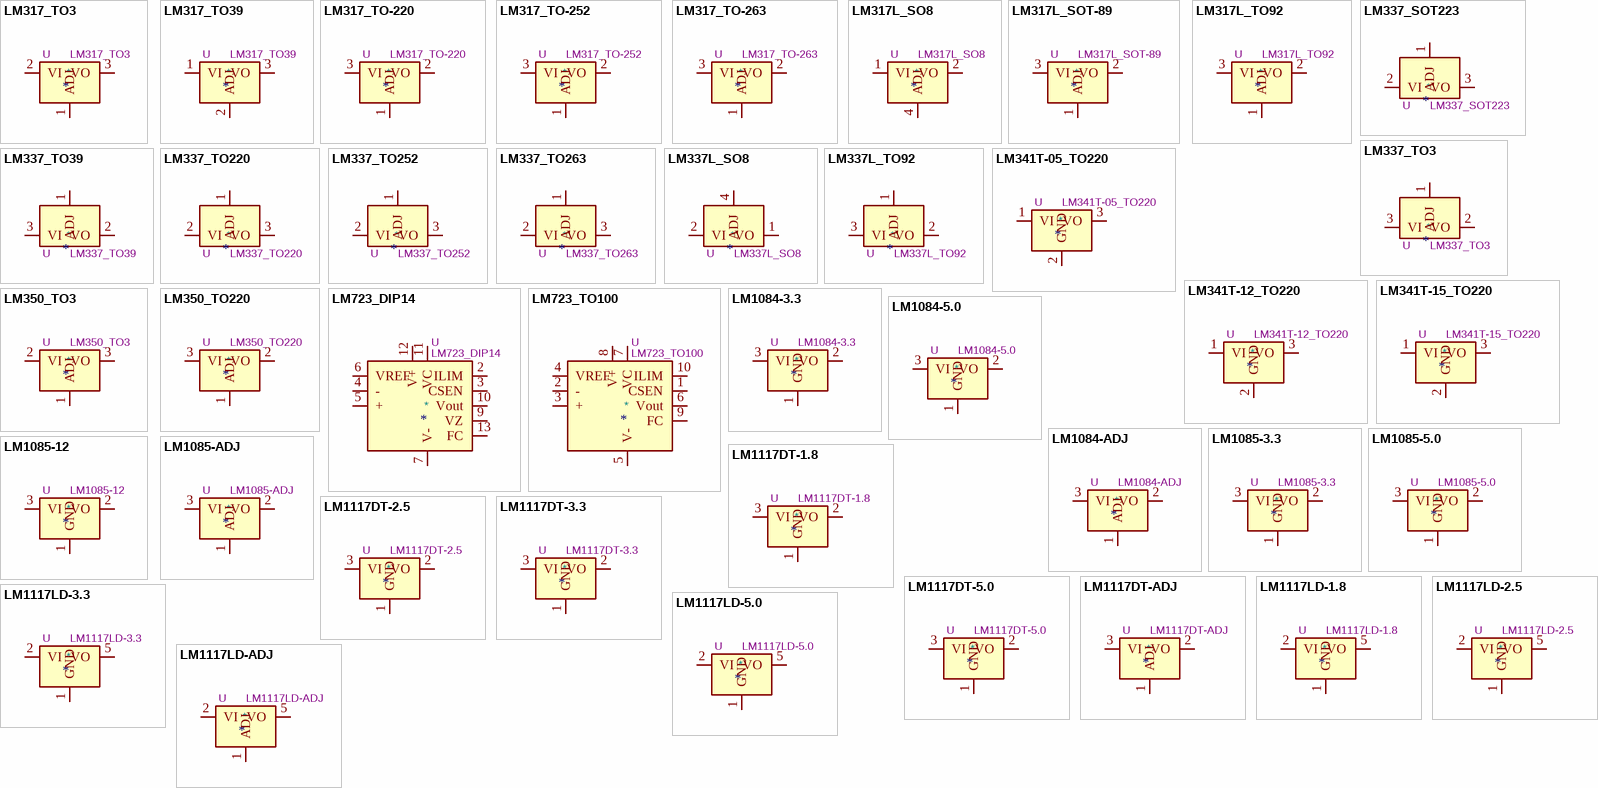
[diagram p13: symbols LM317_TO3 to LM1117LD-ADJ]

## LM317_TO3
designator *  value LM317_TO3  Reference: U
ki_keywords: Adjustable Voltage Regulator 1.5A Positive; ki_description: 1.5A 35V Adjustable Linear Regulator, TO-3; ki_fp_filters: TO?3*; Footprint: Package_TO_SOT_THT:TO-3; Datasheet: http://www.ti.com/lit/ds/symlink/lm317.pdf
pins: 1 ADJ, 2 VI, 3 VO

## LM317_TO39
designator *  value LM317_TO39  Reference: U
ki_keywords: Adjustable Voltage Regulator 500mA Positive; ki_description: 500mA 35V Adjustable Linear Regulator, TO-39; ki_fp_filters: TO?39*; Footprint: Package_TO_SOT_THT:TO-39-3; Datasheet: http://www.ti.com/lit/ds/symlink/lm317.pdf
pins: 1 VI, 2 ADJ, 3 VO

## LM317_TO-220
designator *  value LM317_TO-220  Reference: U
ki_keywords: Adjustable Voltage Regulator 1A Positive; ki_description: 1.5A 35V Adjustable Linear Regulator, TO-220; ki_fp_filters: TO?220*; Footprint: Package_TO_SOT_THT:TO-220-3_Vertical; Datasheet: http://www.ti.com/lit/ds/symlink/lm317.pdf
pins: 1 ADJ, 2 VO, 3 VI

## LM317_TO-252
designator *  value LM317_TO-252  Reference: U
ki_keywords: Adjustable Voltage Regulator 1A Positive; ki_description: 1.5A 35V Adjustable Linear Regulator, TO-252; ki_fp_filters: TO?252*; Footprint: Package_TO_SOT_SMD:TO-252-2; Datasheet: http://www.ti.com/lit/ds/snvs774n/snvs774n.pdf
pins: 1 ADJ, 2 VO, 3 VI

## LM317_TO-263
designator *  value LM317_TO-263  Reference: U
ki_keywords: Adjustable Voltage Regulator 1A Positive; ki_description: 1.5A 35V Adjustable Linear Regulator, TO-263; ki_fp_filters: TO?263*; Footprint: Package_TO_SOT_SMD:TO-263-2; Datasheet: http://www.ti.com/lit/ds/symlink/lm317.pdf
pins: 1 ADJ, 2 VO, 3 VI

## LM317L_SO8
designator *  value LM317L_SO8  Reference: U
ki_keywords: Adjustable Voltage Regulator 100mA Positive; ki_description: 100mA 35V Adjustable Linear Regulator, SO-8; ki_fp_filters: SOIC*3.9x4.9mm*P1.27mm*; Footprint: Package_SO:SOIC-8_3.9x4.9mm_P1.27mm; Datasheet: http://www.ti.com/lit/ds/snvs775k/snvs775k.pdf
pins: 1 VI, 2 VO, 3 VO hidden, 4 ADJ, 5 NC hidden, 6 VO hidden, 7 VO hidden, 8 NC hidden

## LM317L_SOT-89
designator *  value LM317L_SOT-89  Reference: U
ki_keywords: Adjustable Voltage Regulator 1A Positive; ki_description: 100mA 35V Adjustable Linear Regulator, SOT-89; ki_fp_filters: SOT?89*; Footprint: Package_TO_SOT_SMD:SOT-89-3; Datasheet: http://www.ti.com/lit/ds/symlink/lm317l.pdf
pins: 1 ADJ, 2 VO, 3 VI

## LM317L_TO92
designator *  value LM317L_TO92  Reference: U
ki_keywords: Adjustable Voltage Regulator 100mA Positive; ki_description: 100mA 35V Adjustable Linear Regulator, TO-92; ki_fp_filters: TO?92*; Footprint: Package_TO_SOT_THT:TO-92_Inline; Datasheet: http://www.ti.com/lit/ds/snvs775k/snvs775k.pdf
pins: 1 ADJ, 2 VO, 3 VI

## LM337_SOT223
designator *  value LM337_SOT223  Reference: U
ki_keywords: Adjustable Voltage Regulator 1A Negative; ki_description: Negative 1A 35V Adjustable Linear Regulator, SOT-223; ki_fp_filters: SOT?223*; Footprint: Package_TO_SOT_SMD:SOT-223-3_TabPin2; Datasheet: http://www.ti.com/lit/ds/symlink/lm337-n.pdf
pins: 1 ADJ, 2 VI, 3 VO

## LM337_TO3
designator *  value LM337_TO3  Reference: U
ki_keywords: Adjustable Voltage Regulator 1.5A Negative; ki_description: Negative 1.5A 35V Adjustable Linear Regulator, TO-3; ki_fp_filters: TO?3*; Footprint: Package_TO_SOT_THT:TO-3; Datasheet: http://www.ti.com/lit/ds/symlink/lm337-n.pdf
pins: 1 ADJ, 2 VO, 3 VI

## LM337_TO39
designator *  value LM337_TO39  Reference: U
ki_keywords: Adjustable Voltage Regulator 500mA Negative; ki_description: Negative 500mA 35V Adjustable Linear Regulator, TO-39; ki_fp_filters: TO?39*; Footprint: Package_TO_SOT_THT:TO-39-3; Datasheet: http://www.ti.com/lit/ds/symlink/lm337-n.pdf
pins: 1 ADJ, 2 VO, 3 VI

## LM337_TO220
designator *  value LM337_TO220  Reference: U
ki_keywords: Adjustable Voltage Regulator 1.5A Negative; ki_description: Negative 1.5A 35V Adjustable Linear Regulator, TO-220; ki_fp_filters: TO?220*; Footprint: Package_TO_SOT_THT:TO-220-3_Vertical; Datasheet: http://www.ti.com/lit/ds/symlink/lm337-n.pdf
pins: 1 ADJ, 2 VI, 3 VO

## LM337_TO252
designator *  value LM337_TO252  Reference: U
ki_keywords: Adjustable Voltage Regulator 1A Negative; ki_description: Negative 1A 35V Adjustable Linear Regulator, TO-252(DPAK); ki_fp_filters: TO?252*; Footprint: Package_TO_SOT_SMD:TO-252-2; Datasheet: http://www.farnell.com/datasheets/1636957.pdf
pins: 1 ADJ, 2 VI, 3 VO

## LM337_TO263
designator *  value LM337_TO263  Reference: U
ki_keywords: Adjustable Voltage Regulator 1A Negative; ki_description: Negative 1A 35V Adjustable Linear Regulator, TO-263(D2-PAK); ki_fp_filters: TO?263*; Footprint: Package_TO_SOT_SMD:TO-263-2; Datasheet: https://www.onsemi.com/pub/Collateral/LM337-D.PDF
pins: 1 ADJ, 2 VI, 3 VO

## LM337L_SO8
designator *  value LM337L_SO8  Reference: U
ki_keywords: Adjustable Negative Voltage Regulator 100mA; ki_description: 100mA 35V Adjustable Negative Linear Regulator, SO-8; ki_fp_filters: SOIC*3.9x4.9mm*P1.27mm*; Footprint: Package_SO:SOIC-8_3.9x4.9mm_P1.27mm; Datasheet: http://www.ti.com/lit/ds/symlink/lm337l.pdf
pins: 1 VO, 2 VI, 3 VI hidden, 4 ADJ, 5 NC hidden, 6 VI hidden, 7 VI hidden, 8 NC hidden

## LM337L_TO92
designator *  value LM337L_TO92  Reference: U
ki_keywords: Adjustable Voltage Regulator 100mA Negative; ki_description: Negative 100mA 35V Adjustable Linear Regulator, TO-92; ki_fp_filters: TO?92*; Footprint: Package_TO_SOT_THT:TO-92_Inline; Datasheet: http://www.ti.com/lit/ds/symlink/lm337l.pdf
pins: 1 ADJ, 2 VO, 3 VI

## LM341T-05_TO220
designator *  value LM341T-05_TO220  Reference: U
ki_keywords: Voltage Regulator 500mA Positive; ki_description: Positive 500mA 35V Linear Regulator, Fixed Output 5V, TO-220; ki_fp_filters: TO?220*; Footprint: Package_TO_SOT_THT:TO-220-3_Vertical; Datasheet: https://www.ti.com/lit/ds/symlink/lm341.pdf
pins: 1 VI, 2 GND, 3 VO

## LM341T-12_TO220
designator *  value LM341T-12_TO220  Reference: U
ki_keywords: Voltage Regulator 500mA Positive; ki_description: Positive 500mA 35V Linear Regulator, Fixed Output 12V, TO-220; ki_fp_filters: TO?220*; Footprint: Package_TO_SOT_THT:TO-220-3_Vertical; Datasheet: https://www.ti.com/lit/ds/symlink/lm341.pdf
pins: 1 VI, 2 GND, 3 VO

## LM341T-15_TO220
designator *  value LM341T-15_TO220  Reference: U
ki_keywords: Voltage Regulator 500mA Positive; ki_description: Positive 500mA 35V Linear Regulator, Fixed Output 15V, TO-220; ki_fp_filters: TO?220*; Footprint: Package_TO_SOT_THT:TO-220-3_Vertical; Datasheet: https://www.ti.com/lit/ds/symlink/lm341.pdf
pins: 1 VI, 2 GND, 3 VO